# Altium footprint library sun_library.PcbLib: 412 footprints (part 4 of 26)
Each footprint in its own frame and in the unit in brackets; x right, y up, seen from the top. Pads: shape width x height; smd on the part's side, far side on the other; paste and mask are expansions set on the pad; w line width, h text height; cw(c..) or ccw(c..) is an arc to the next point about the centre after c.
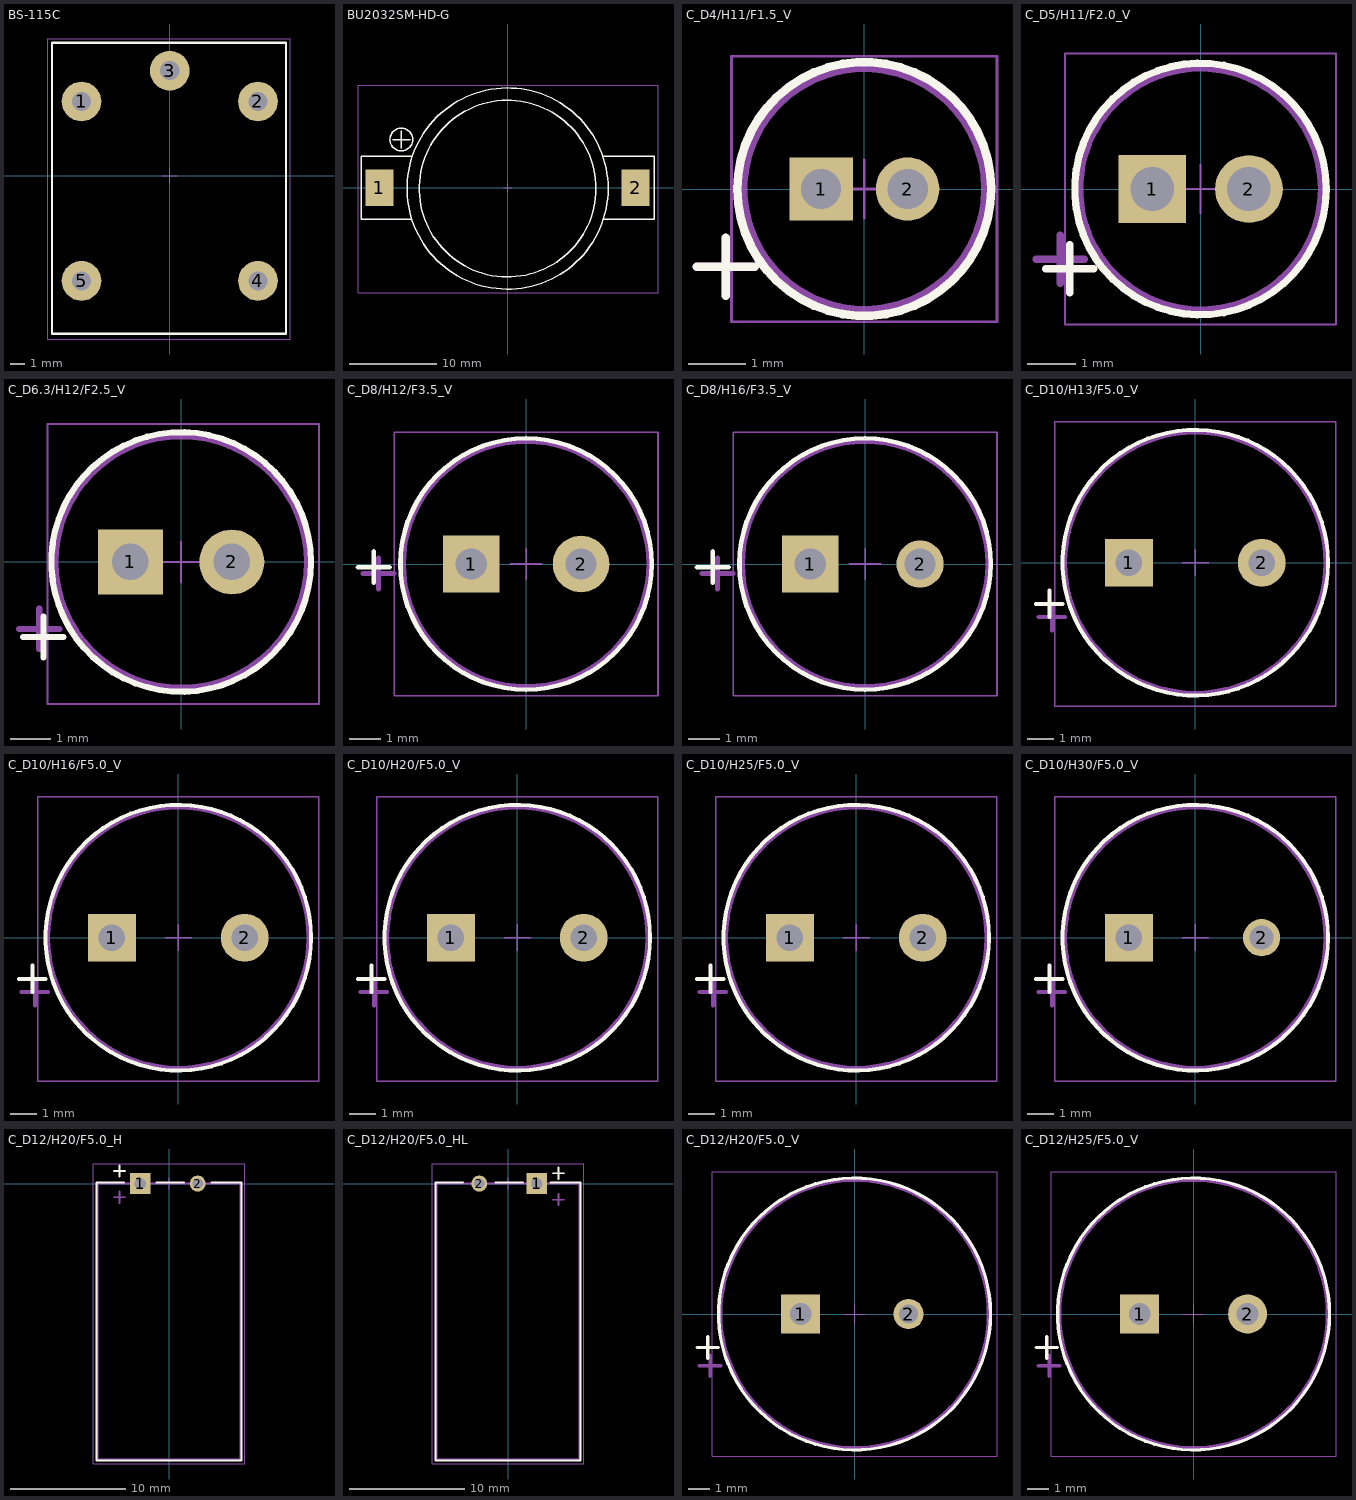
[diagram p3: the footprints below, top view; thin cyan lines are the x and y axes]

## BS-115C [mm] "Реле BS-115C"
height 15
pads (5):
  round 2.7 hole 1.3: 1(-6,5.05) 2(6,5.05) 3(0,7.15) 4(6,-7.15) 5(-6,-7.15)
Top Overlay:
  lines w0.15: -8,-10.75 -8,9.05 7.9,9.05 7.9,-10.75 -8,-10.75
CourtTop 15:
  lines w0.05: -0.5,0 0.5,0 ; 0,-0.5 0,0.5 ; -8.3,-11.1 -8.3,9.3 8.2,9.3 8.2,-11.1 -8.3,-11.1
3D body "User Library-BS-115c.step": height 15.21, standoff -1.5, extent -7.8,-10.45 7.7,8.55

## BU2032SM-HD-G [mm] "BU2032SM-HD-G_BAT_HOLDER"
height 5.3
pads (2):
  rect 3.2x4.2 smd: 1(-14.65,0) 2(14.65,0)
Top Overlay:
  circle w0.15: c-12.15,5.5 r1.301
  circle w0.15: c0,-0.1 r11.5
  circle w0.15: c0,-0.1 r10.1
  lines w0.15: -13.15,5.5 -11.15,5.5 ; -12.15,4.5 -12.15,6.5 ; -10.95,-3.6 -16.75,-3.6 -16.75,3.6 -10.95,3.6 ; 10.95,-3.6 16.75,-3.6 16.75,3.6 10.95,3.6
CourtTop 15:
  lines w0.05: -0.5,0 0.5,0 ; 0,-0.5 0,0.5 ; -17.1,-12 17.2,-12 17.2,11.7 -17.1,11.7 -17.1,-12
3D body "User Library-BU2032SM-HD-G(CR2032 Battery Holder).step": height 5.3, standoff 0, extent -15.85,-10 16.15,10

## C_D4/H11/F1.5_V [mm]
pads (2):
  rect 1.1x1.1 hole 0.7: 1(-0.75,0)
  round 1.1 hole 0.7: 2(0.75,0)
Top Overlay:
  circle w0.15: c0,0 r2.2
  lines w0.15: -2.9,-1.35 -1.9,-1.35 ; -2.4,-1.85 -2.4,-0.85
TopAssy 13:
  circle w0.15: c0,0 r2.1
  lines w0.15: -2.9,-1.35 -1.9,-1.35 ; -2.4,-1.85 -2.4,-0.85
CourtTop 15:
  lines w0.05: -0.5,0 0.5,0 ; 0,-0.5 0,0.5 ; -2.3,-2.3 2.3,-2.3 2.3,2.3 -2.3,2.3 -2.3,-2.3
3D body "User Library-Cap-EL(4x6-1_5)T.step": height 6.31, standoff -3.29, extent -2,-1.999 2.002,2

## C_D5/H11/F2.0_V [mm]
pads (2):
  rect 1.4x1.4 hole 0.9: 1(-1,0)
  round 1.4 hole 0.9: 2(1,0)
Top Overlay:
  circle w0.15: c0,0 r2.6
  lines w0.15: -3.2,-1.65 -2.2,-1.65 ; -2.7,-2.15 -2.7,-1.15
TopAssy 13:
  circle w0.15: c0,0 r2.5
  lines w0.15: -3.4,-1.45 -2.4,-1.45 ; -2.9,-1.95 -2.9,-0.95
CourtTop 15:
  lines w0.05: -0.5,0 0.5,0 ; 0,-0.5 0,0.5 ; -2.8,-2.8 -2.8,2.8 2.8,2.8 2.8,-2.8 -2.8,-2.8
3D body "User Library-Cap-EL(5x11-2)T.step": height 11.01, standoff -2.79, extent -2.5,-2.499 2.502,2.499

## C_D6.3/H12/F2.5_V [mm]
pads (2):
  rect 1.6x1.6 hole 0.9: 1(-1.25,0)
  round 1.6 hole 0.9: 2(1.25,0)
Top Overlay:
  circle w0.15: c0,0 r3.202
  lines w0.15: -3.9,-1.85 -2.9,-1.85 ; -3.4,-2.35 -3.4,-1.35
TopAssy 13:
  circle w0.15: c0,0 r3.102
  lines w0.15: -4,-1.65 -3,-1.65 ; -3.5,-2.15 -3.5,-1.15
CourtTop 15:
  lines w0.05: -0.5,0 0.5,0 ; 0,-0.5 0,0.5 ; -3.3,-3.5 -3.3,3.4 3.4,3.4 3.4,-3.5 -3.3,-3.5
3D body "User Library-Cap-EL(6_3x12-2_5).step": height 11.71, standoff -3.49, extent -3.15,-3.15 3.152,3.15

## C_D8/H12/F3.5_V [mm]
pads (2):
  rect 1.8x1.8 hole 1: 1(-1.75,0)
  round 1.8 hole 1: 2(1.75,0)
Top Overlay:
  circle w0.15: c0,0 r4
  lines w0.15: -5.35,-0.1 -4.35,-0.1 ; -4.85,-0.6 -4.85,0.4
TopAssy 13:
  circle w0.15: c0,0 r3.901
  lines w0.15: -5.2,-0.3 -4.2,-0.3 ; -4.7,-0.8 -4.7,0.2
CourtTop 15:
  lines w0.05: -0.5,0 0.5,0 ; 0,-0.5 0,0.5 ; -4.2,-4.2 4.2,-4.2 4.2,4.2 -4.2,4.2 -4.2,-4.2
3D body "User Library-Cap-EL(8x12-3_5)T.step": height 12.05, standoff -3.55, extent -4,-4.002 4.002,3.998

## C_D8/H16/F3.5_V [mm]
pads (2):
  rect 1.8x1.8 hole 1: 1(-1.75,0)
  round 1.5 hole 1: 2(1.75,0)
Top Overlay:
  circle w0.15: c0,0 r4
  lines w0.15: -5.35,-0.1 -4.35,-0.1 ; -4.85,-0.6 -4.85,0.4
TopAssy 13:
  circle w0.15: c0,0 r3.901
  lines w0.15: -5.2,-0.3 -4.2,-0.3 ; -4.7,-0.8 -4.7,0.2
CourtTop 15:
  lines w0.05: -0.5,0 0.5,0 ; 0,-0.5 0,0.5 ; -4.2,-4.2 -4.2,4.2 4.2,4.2 4.2,-4.2 -4.2,-4.2
3D body "User Library-Cap-EL(8x16-3_5).step": height 16.01, standoff -3.29, extent -4,-4.002 4.002,3.998

## C_D10/H13/F5.0_V [mm]
pads (2):
  rect 1.8x1.8 hole 1: 1(-2.5,0)
  round 1.8 hole 1: 2(2.5,0)
Top Overlay:
  circle w0.15: c0,0 r5.004
  lines w0.15: -6,-1.55 -5,-1.55 ; -5.5,-2.05 -5.5,-1.05
TopAssy 13:
  circle w0.15: c0,0 r4.901
  lines w0.15: -5.9,-2.05 -4.9,-2.05 ; -5.4,-2.55 -5.4,-1.55
CourtTop 15:
  lines w0.05: -0.5,0 0.5,0 ; 0,-0.5 0,0.5 ; -5.3,-5.4 5.3,-5.4 5.3,5.3 -5.3,5.3 -5.3,-5.4
3D body "User Library-Cap-EL(10x13_5-5)T.step": height 14.01, standoff -3.49, extent -5,-5 5.002,5

## C_D10/H16/F5.0_V [mm]
pads (2):
  rect 1.8x1.8 hole 1: 1(-2.5,0)
  round 1.8 hole 1: 2(2.5,0)
Top Overlay:
  circle w0.15: c0,0 r5.004
  lines w0.15: -6,-1.55 -5,-1.55 ; -5.5,-2.05 -5.5,-1.05
TopAssy 13:
  circle w0.15: c0,0 r4.901
  lines w0.15: -5.9,-2.05 -4.9,-2.05 ; -5.4,-2.55 -5.4,-1.55
CourtTop 15:
  lines w0.05: -0.5,0 0.5,0 ; 0,-0.5 0,0.5 ; -5.3,-5.4 5.3,-5.4 5.3,5.3 -5.3,5.3 -5.3,-5.4
3D body "User Library-Cap-EL(10x16-5)T.step": height 16.51, standoff -2.49, extent -5,-4.999 5.002,5

## C_D10/H20/F5.0_V [mm]
pads (2):
  rect 1.8x1.8 hole 1: 1(-2.5,0)
  round 1.8 hole 1: 2(2.5,0)
Top Overlay:
  circle w0.15: c0,0 r5.004
  lines w0.15: -6,-1.55 -5,-1.55 ; -5.5,-2.05 -5.5,-1.05
TopAssy 13:
  circle w0.15: c0,0 r4.901
  lines w0.15: -5.9,-2.05 -4.9,-2.05 ; -5.4,-2.55 -5.4,-1.55
CourtTop 15:
  lines w0.05: -0.5,0 0.5,0 ; 0,-0.5 0,0.5 ; -5.3,-5.4 5.3,-5.4 5.3,5.3 -5.3,5.3 -5.3,-5.4
3D body "User Library-Cap-EL(10x20-5).step": height 20.01, standoff -3.29, extent -5,-5 5.002,5

## C_D10/H25/F5.0_V [mm]
pads (2):
  rect 1.8x1.8 hole 1: 1(-2.5,0)
  round 1.8 hole 1: 2(2.5,0)
Top Overlay:
  circle w0.15: c0,0 r5.004
  lines w0.15: -6,-1.55 -5,-1.55 ; -5.5,-2.05 -5.5,-1.05
TopAssy 13:
  circle w0.15: c0,0 r4.901
  lines w0.15: -5.9,-2.05 -4.9,-2.05 ; -5.4,-2.55 -5.4,-1.55
CourtTop 15:
  lines w0.05: -0.5,0 0.5,0 ; 0,-0.5 0,0.5 ; -5.3,-5.4 5.3,-5.4 5.3,5.3 -5.3,5.3 -5.3,-5.4
3D body "User Library-Cap-EL(10x25-5).step": height 25.01, standoff -3.29, extent -5,-4.998 5.002,4.999

## C_D10/H30/F5.0_V [mm]
pads (2):
  rect 1.8x1.8 hole 1: 1(-2.5,0)
  round 1.4 hole 0.9: 2(2.5,0)
Top Overlay:
  circle w0.15: c0,0 r5.004
  lines w0.15: -6,-1.55 -5,-1.55 ; -5.5,-2.05 -5.5,-1.05
TopAssy 13:
  circle w0.15: c0,0 r4.901
  lines w0.15: -5.9,-2.05 -4.9,-2.05 ; -5.4,-2.55 -5.4,-1.55
CourtTop 15:
  lines w0.05: -0.5,0 0.5,0 ; 0,-0.5 0,0.5 ; -5.3,-5.4 -5.3,5.3 5.3,5.3 5.3,-5.4 -5.3,-5.4
3D body "User Library-Cap-EL(10x30-5)T.step": height 30.51, standoff -3.49, extent -5,-4.997 5.002,4.997

## C_D12/H20/F5.0_H [mm]
pads (2):
  rect 1.8x1.8 hole 1: 1(-2.5,0)
  round 1.4 hole 0.9: 2(2.5,0)
Top Overlay:
  lines w0.15: -4.8,1.1 -3.8,1.1 ; -4.3,0.6 -4.3,1.6 ; -3.9,0.1 -6.3,0.1 -6.3,-24.1 6.3,-24.1 6.3,0.1 3.7,0.1 ; -1.1,0.1 1.3,0.1
TopAssy 13:
  lines w0.15: -4.8,-1.2 -3.8,-1.2 ; -4.3,-1.7 -4.3,-0.7 ; -6.2,-24 -6.2,0 6.2,0 6.2,-24 -6.2,-24
CourtTop 15:
  lines w0.05: -0.5,0 0.5,0 ; 0,-0.5 0,0.5 ; -6.6,-24.4 -6.6,1.7 6.6,1.7 6.6,-24.4 -6.6,-24.4
3D body "User Library-Cap-EL(12_5x20-5)T.step": height 12.55, standoff 0.05, extent -6.25,-24.002 6.252,0

## C_D12/H20/F5.0_HL [mm]
pads (2):
  rect 1.8x1.8 hole 1: 1(2.5,0)
  round 1.4 hole 0.9: 2(-2.5,0)
Top Overlay:
  lines w0.15: -3.9,0.1 -6.3,0.1 -6.3,-24.1 6.3,-24.1 6.3,0.1 3.7,0.1 ; -1.1,0.1 1.3,0.1 ; 3.9,0.9 4.9,0.9 ; 4.4,0.4 4.4,1.4
TopAssy 13:
  lines w0.15: 3.9,-1.4 4.9,-1.4 ; 4.4,-1.9 4.4,-0.9 ; -6.2,-24 6.2,-24 6.2,0 -6.2,0 -6.2,-24
CourtTop 15:
  lines w0.05: -0.5,0 0.5,0 ; 0,-0.5 0,0.5 ; -6.6,-24.4 6.6,-24.4 6.6,1.7 -6.6,1.7 -6.6,-24.4
3D body "User Library-Cap-EL(12_5x20-5)T.step": height 12.55, standoff 0.05, extent -6.252,-24.002 6.25,0

## C_D12/H20/F5.0_V [mm]
pads (2):
  rect 1.8x1.8 hole 1: 1(-2.5,0)
  round 1.4 hole 0.9: 2(2.5,0)
Top Overlay:
  circle w0.15: c0,0 r6.3
  lines w0.15: -7.3,-1.55 -6.3,-1.55 ; -6.8,-2.05 -6.8,-1.05
TopAssy 13:
  circle w0.15: c0,0 r6.2
  lines w0.15: -7.2,-2.4 -6.2,-2.4 ; -6.7,-2.9 -6.7,-1.9
CourtTop 15:
  lines w0.05: -0.5,0 0.5,0 ; 0,-0.5 0,0.5 ; -6.6,-6.6 6.6,-6.6 6.6,6.6 -6.6,6.6 -6.6,-6.6
3D body "User Library-Cap-EL(12_5x20-5)T.step": height 20.51, standoff -3.49, extent -6.25,-6.25 6.252,6.25

## C_D12/H25/F5.0_V [mm]
pads (2):
  rect 1.8x1.8 hole 1: 1(-2.5,0)
  round 1.8 hole 1: 2(2.5,0)
Top Overlay:
  circle w0.15: c0,0 r6.3
  lines w0.15: -7.3,-1.55 -6.3,-1.55 ; -6.8,-2.05 -6.8,-1.05
TopAssy 13:
  circle w0.15: c0,0 r6.2
  lines w0.15: -7.2,-2.4 -6.2,-2.4 ; -6.7,-2.9 -6.7,-1.9
CourtTop 15:
  lines w0.05: -0.5,0 0.5,0 ; 0,-0.5 0,0.5 ; -6.6,-6.6 -6.6,6.6 6.6,6.6 6.6,-6.6 -6.6,-6.6
3D body "User Library-Cap-EL(12_5x25-5)T.step": height 25.51, standoff -3.49, extent -6.25,-6.249 6.252,6.25